# Altium footprint library SMT.PcbLib: 379 footprints (part 24 of 24)
Each footprint in its own frame and in the unit in brackets; x right, y up, seen from the top. Pads: shape width x height; smd on the part's side, far side on the other; paste and mask are expansions set on the pad; w line width, h text height; cw(c..) or ccw(c..) is an arc to the next point about the centre after c.
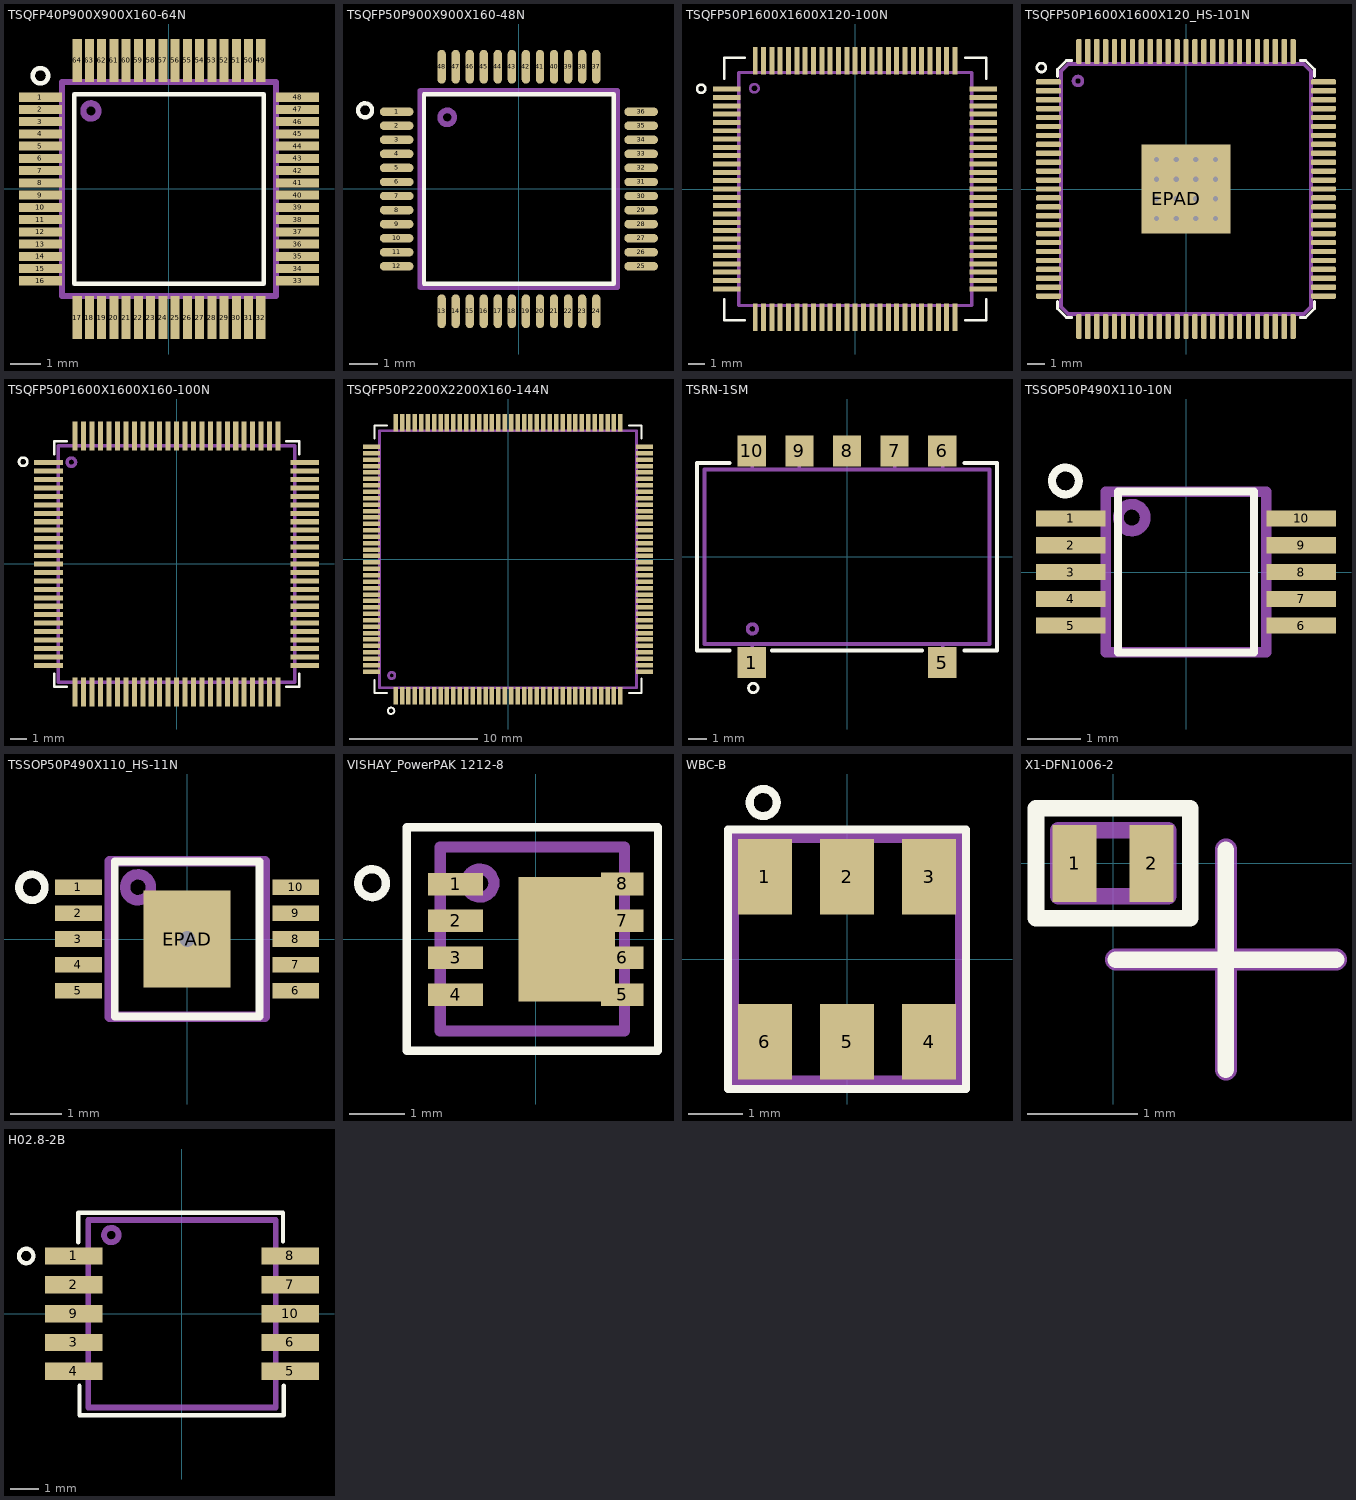
[diagram p23: the footprints below, top view; thin cyan lines are the x and y axes]

## TSQFP40P900X900X160-64N [mm] "TSQFP, 64-Leads, Body 7,00x7,00mm, Pitch 0,40mm, IPC Medium Density"
height 1.6
pads (64):
  rect 1.4x0.3 smd paste-0.05 mask+0.05: 1(-4.2,3) 2(-4.2,2.6) 3(-4.2,2.2) 4(-4.2,1.8) 5(-4.2,1.4) 6(-4.2,1) 7(-4.2,0.6) 8(-4.2,0.2) 9(-4.2,-0.2) 10(-4.2,-0.6) 11(-4.2,-1) 12(-4.2,-1.4) 13(-4.2,-1.8) 14(-4.2,-2.2) 15(-4.2,-2.6) 16(-4.2,-3) 33(4.2,-3) 34(4.2,-2.6) 35(4.2,-2.2) 36(4.2,-1.8) 37(4.2,-1.4) 38(4.2,-1) 39(4.2,-0.6) 40(4.2,-0.2) 41(4.2,0.2) 42(4.2,0.6) 43(4.2,1) 44(4.2,1.4) 45(4.2,1.8) 46(4.2,2.2) 47(4.2,2.6) 48(4.2,3)
  rect 0.3x1.4 smd paste-0.05 mask+0.05: 17(-3,-4.2) 18(-2.6,-4.2) 19(-2.2,-4.2) 20(-1.8,-4.2) 21(-1.4,-4.2) 22(-1,-4.2) 23(-0.6,-4.2) 24(-0.2,-4.2) 25(0.2,-4.2) 26(0.6,-4.2) 27(1,-4.2) 28(1.4,-4.2) 29(1.8,-4.2) 30(2.2,-4.2) 31(2.6,-4.2) 32(3,-4.2) 49(3,4.2) 50(2.6,4.2) 51(2.2,4.2) 52(1.8,4.2) 53(1.4,4.2) 54(1,4.2) 55(0.6,4.2) 56(0.2,4.2) 57(-0.2,4.2) 58(-0.6,4.2) 59(-1,4.2) 60(-1.4,4.2) 61(-1.8,4.2) 62(-2.2,4.2) 63(-2.6,4.2) 64(-3,4.2)
Top Overlay:
  circle w0.15: c-4.2,3.7 r0.25
  lines w0.15: -3.1,-3.1 3.1,-3.1 3.1,3.1 -3.1,3.1 -3.1,-3.1
Mechanical 1:
  circle w0.2: c-2.55,2.55 r0.25
  lines w0.2: -3.5,-3.5 3.5,-3.5 3.5,3.5 -3.5,3.5 -3.5,-3.5
3D body "TSQFP40P900X900X160-64N.step": height 1.6, standoff 0, extent -4.5,-4.5 4.5,4.5

## TSQFP50P900X900X160-48N [mm] "TSQFP, 48-Leads, Body 7,00x7,00mm, Pitch 0,50mm, IPC Medium Density"
height 1.6
pads (48):
  oval 1.2x0.3 smd mask+0.04: 1(-4.35,2.75) 2(-4.35,2.25) 3(-4.35,1.75) 4(-4.35,1.25) 5(-4.35,0.75) 6(-4.35,0.25) 7(-4.35,-0.25) 8(-4.35,-0.75) 9(-4.35,-1.25) 10(-4.35,-1.75) 11(-4.35,-2.25) 12(-4.35,-2.75) 25(4.35,-2.75) 26(4.35,-2.25) 27(4.35,-1.75) 28(4.35,-1.25) 29(4.35,-0.75) 30(4.35,-0.25) 31(4.35,0.25) 32(4.35,0.75) 33(4.35,1.25) 34(4.35,1.75) 35(4.35,2.25) 36(4.35,2.75)
  oval 0.3x1.2 smd mask+0.04: 13(-2.75,-4.35) 14(-2.25,-4.35) 15(-1.75,-4.35) 16(-1.25,-4.35) 17(-0.75,-4.35) 18(-0.25,-4.35) 19(0.25,-4.35) 20(0.75,-4.35) 21(1.25,-4.35) 22(1.75,-4.35) 23(2.25,-4.35) 24(2.75,-4.35) 37(2.75,4.35) 38(2.25,4.35) 39(1.75,4.35) 40(1.25,4.35) 41(0.75,4.35) 42(0.25,4.35) 43(-0.25,4.35) 44(-0.75,4.35) 45(-1.25,4.35) 46(-1.75,4.35) 47(-2.25,4.35) 48(-2.75,4.35)
Top Overlay:
  circle w0.15: c-5.475,2.8 r0.25
  lines w0.15: -3.375,-3.375 -3.375,3.375 3.375,3.375 3.375,-3.375 -3.375,-3.375
Mechanical 1:
  circle w0.2: c-2.55,2.55 r0.25
  lines w0.2: -3.5,-3.5 -3.5,3.5 3.5,3.5 3.5,-3.5 -3.5,-3.5
3D body "TSQFP50P900X900X160-48N.step": height 1.6, standoff 0, extent -4.5,-4.5 4.5,4.5

## TSQFP50P1600X1600X120-100N [mm] "TSQFP, 100-Leads, Body 14,00x14,00mm, Pitch 0,50mm, IPC Medium Density"
height 1.2
pads (100):
  rect 1.65x0.3 smd paste+0 mask+0.01: 1(-7.7,6) 2(-7.7,5.5) 3(-7.7,5) 4(-7.7,4.5) 5(-7.7,4) 6(-7.7,3.5) 7(-7.7,3) 8(-7.7,2.5) 9(-7.7,2) 10(-7.7,1.5) 11(-7.7,1) 12(-7.7,0.5) 13(-7.7,0) 14(-7.7,-0.5) 15(-7.7,-1) 16(-7.7,-1.5) 17(-7.7,-2) 18(-7.7,-2.5) 19(-7.7,-3) 20(-7.7,-3.5) 21(-7.7,-4) 22(-7.7,-4.5) 23(-7.7,-5) 24(-7.7,-5.5) 25(-7.7,-6) 51(7.7,-6) 52(7.7,-5.5) 53(7.7,-5) 54(7.7,-4.5) 55(7.7,-4) 56(7.7,-3.5) 57(7.7,-3) 58(7.7,-2.5) 59(7.7,-2) 60(7.7,-1.5) 61(7.7,-1) 62(7.7,-0.5) 63(7.7,0) 64(7.7,0.5) 65(7.7,1) 66(7.7,1.5) 67(7.7,2) 68(7.7,2.5) 69(7.7,3) 70(7.7,3.5) 71(7.7,4) 72(7.7,4.5) 73(7.7,5) 74(7.7,5.5) 75(7.7,6)
  rect 0.3x1.65 smd paste+0 mask+0.01: 26(-6,-7.7) 27(-5.5,-7.7) 28(-5,-7.7) 29(-4.5,-7.7) 30(-4,-7.7) 31(-3.5,-7.7) 32(-3,-7.7) 33(-2.5,-7.7) 34(-2,-7.7) 35(-1.5,-7.7) 36(-1,-7.7) 37(-0.5,-7.7) 38(0,-7.7) 39(0.5,-7.7) 40(1,-7.7) 41(1.5,-7.7) 42(2,-7.7) 43(2.5,-7.7) 44(3,-7.7) 45(3.5,-7.7) 46(4,-7.7) 47(4.5,-7.7) 48(5,-7.7) 49(5.5,-7.7) 50(6,-7.7) 76(6,7.7) 77(5.5,7.7) 78(5,7.7) 79(4.5,7.7) 80(4,7.7) 81(3.5,7.7) 82(3,7.7) 83(2.5,7.7) 84(2,7.7) 85(1.5,7.7) 86(1,7.7) 87(0.5,7.7) 88(0,7.7) 89(-0.5,7.7) 90(-1,7.7) 91(-1.5,7.7) 92(-2,7.7) 93(-2.5,7.7) 94(-3,7.7) 95(-3.5,7.7) 96(-4,7.7) 97(-4.5,7.7) 98(-5,7.7) 99(-5.5,7.7) 100(-6,7.7)
Top Overlay:
  circle w0.15: c-9.25,6.025 r0.25
  lines w0.15: -7.875,-6.625 -7.875,-7.875 -6.625,-7.875 ; -7.875,6.625 -7.875,7.875 -6.625,7.875 ; 6.625,-7.875 7.875,-7.875 7.875,-6.625 ; 6.625,7.875 7.875,7.875 7.875,6.625
Mechanical 1:
  circle w0.15: c-6.05,6.05 r0.25
  lines w0.2: -7,-7 7,-7 7,7 -7,7 -7,-7
3D body "User Library-LQFP100-3.STEP": height 1.62, standoff -0.01, extent -8.072,-8.072 8.072,8.072

## TSQFP50P1600X1600X120_HS-101N [mm] "TSQFP, 100-Leads, Body 14,00x14,00mm, Pitch 0,50mm, Thermal Pad 5,00x5,00mm, IPC Medium Density"
height 1.2
pads (101):
  rrect50% 1.4x0.3 smd mask+0.05: 1(-7.7,6) 2(-7.7,5.5) 3(-7.7,5) 4(-7.7,4.5) 5(-7.7,4) 6(-7.7,3.5) 7(-7.7,3) 8(-7.7,2.5) 9(-7.7,2) 10(-7.7,1.5) 11(-7.7,1) 12(-7.7,0.5) 13(-7.7,0) 14(-7.7,-0.5) 15(-7.7,-1) 16(-7.7,-1.5) 17(-7.7,-2) 18(-7.7,-2.5) 19(-7.7,-3) 20(-7.7,-3.5) 21(-7.7,-4) 22(-7.7,-4.5) 23(-7.7,-5) 24(-7.7,-5.5) 25(-7.7,-6) 51(7.7,-6) 52(7.7,-5.5) 53(7.7,-5) 54(7.7,-4.5) 55(7.7,-4) 56(7.7,-3.5) 57(7.7,-3) 58(7.7,-2.5) 59(7.7,-2) 60(7.7,-1.5) 61(7.7,-1) 62(7.7,-0.5) 63(7.7,0) 64(7.7,0.5) 65(7.7,1) 66(7.7,1.5) 67(7.7,2) 68(7.7,2.5) 69(7.7,3) 70(7.7,3.5) 71(7.7,4) 72(7.7,4.5) 73(7.7,5) 74(7.7,5.5) 75(7.7,6)
  rrect50% 0.3x1.4 smd mask+0.05: 26(-6,-7.7) 27(-5.5,-7.7) 28(-5,-7.7) 29(-4.5,-7.7) 30(-4,-7.7) 31(-3.5,-7.7) 32(-3,-7.7) 33(-2.5,-7.7) 34(-2,-7.7) 35(-1.5,-7.7) 36(-1,-7.7) 37(-0.5,-7.7) 38(0,-7.7) 39(0.5,-7.7) 40(1,-7.7) 41(1.5,-7.7) 42(2,-7.7) 43(2.5,-7.7) 44(3,-7.7) 45(3.5,-7.7) 46(4,-7.7) 47(4.5,-7.7) 48(5,-7.7) 49(5.5,-7.7) 50(6,-7.7) 76(6,7.7) 77(5.5,7.7) 78(5,7.7) 79(4.5,7.7) 80(4,7.7) 81(3.5,7.7) 82(3,7.7) 83(2.5,7.7) 84(2,7.7) 85(1.5,7.7) 86(1,7.7) 87(0.5,7.7) 88(0,7.7) 89(-0.5,7.7) 90(-1,7.7) 91(-1.5,7.7) 92(-2,7.7) 93(-2.5,7.7) 94(-3,7.7) 95(-3.5,7.7) 96(-4,7.7) 97(-4.5,7.7) 98(-5,7.7) 99(-5.5,7.7) 100(-6,7.7)
  rect 5x5 hole 0.3 copper offset 0.55,0.55: EPAD(-0.55,-0.55)
via 1.65,-1.65 diameter 0.6 hole 0.3
via 0.55,-1.65 diameter 0.6 hole 0.3
via -0.55,-1.65 diameter 0.6 hole 0.3
via -1.65,-1.65 diameter 0.6 hole 0.3
via 1.65,-0.55 diameter 0.6 hole 0.3
via 0.55,-0.55 diameter 0.6 hole 0.3
via -1.65,-0.55 diameter 0.6 hole 0.3
via 1.65,0.55 diameter 0.6 hole 0.3
via 0.55,0.55 diameter 0.6 hole 0.3
via -0.55,0.55 diameter 0.6 hole 0.3
via -1.65,0.55 diameter 0.6 hole 0.3
via 1.65,1.65 diameter 0.6 hole 0.3
via 0.55,1.65 diameter 0.6 hole 0.3
via -0.55,1.65 diameter 0.6 hole 0.3
via -1.65,1.65 diameter 0.6 hole 0.3
Top Overlay:
  circle w0.15: c-8.1,6.8 r0.25
  lines w0.15: -7.2,-6.3 -7.2,-6.7 -6.7,-7.2 -6.4,-7.2 ; -7.2,6.3 -7.2,6.7 -6.7,7.2 -6.4,7.2 ; 6.4,-7.2 6.7,-7.2 7.2,-6.7 7.2,-6.3 ; 6.4,7.2 6.7,7.2 7.2,6.7 7.2,6.3
Top Paste:
  rectangle: -2.3,-2.3 -0.1,2.3
  rectangle: 0.1,-2.3 2.3,2.3
Mechanical 1:
  circle w0.2: c-6.05,6.05 r0.25
  lines w0.2: -7,-6.6 -7,6.6 -6.6,7 6.6,7 7,6.6 7,-6.6 6.6,-7 -6.6,-7 -7,-6.6
3D body "TSQFP50P1600X1600X120_HS-101N.step": height 1.2, standoff 0, extent -8,-8 8,8

## TSQFP50P1600X1600X160-100N [mm] "TSQFP, 100-Leads, Body 14,00x14,00mm, Pitch 0,50mm, IPC Medium Density"
height 1.6
pads (100):
  rect 1.7x0.3 smd paste+0 mask+0.01: 1(-7.575,6) 2(-7.575,5.5) 3(-7.575,5) 4(-7.575,4.5) 5(-7.575,4) 6(-7.575,3.5) 7(-7.575,3) 8(-7.575,2.5) 9(-7.575,2) 10(-7.575,1.5) 11(-7.575,1) 12(-7.575,0.5) 13(-7.575,0) 14(-7.575,-0.5) 15(-7.575,-1) 16(-7.575,-1.5) 17(-7.575,-2) 18(-7.575,-2.5) 19(-7.575,-3) 20(-7.575,-3.5) 21(-7.575,-4) 22(-7.575,-4.5) 23(-7.575,-5) 24(-7.575,-5.5) 25(-7.575,-6) 51(7.575,-6) 52(7.575,-5.5) 53(7.575,-5) 54(7.575,-4.5) 55(7.575,-4) 56(7.575,-3.5) 57(7.575,-3) 58(7.575,-2.5) 59(7.575,-2) 60(7.575,-1.5) 61(7.575,-1) 62(7.575,-0.5) 63(7.575,0) 64(7.575,0.5) 65(7.575,1) 66(7.575,1.5) 67(7.575,2) 68(7.575,2.5) 69(7.575,3) 70(7.575,3.5) 71(7.575,4) 72(7.575,4.5) 73(7.575,5) 74(7.575,5.5) 75(7.575,6)
  rect 0.3x1.7 smd paste+0 mask+0.01: 26(-6,-7.575) 27(-5.5,-7.575) 28(-5,-7.575) 29(-4.5,-7.575) 30(-4,-7.575) 31(-3.5,-7.575) 32(-3,-7.575) 33(-2.5,-7.575) 34(-2,-7.575) 35(-1.5,-7.575) 36(-1,-7.575) 37(-0.5,-7.575) 38(0,-7.575) 39(0.5,-7.575) 40(1,-7.575) 41(1.5,-7.575) 42(2,-7.575) 43(2.5,-7.575) 44(3,-7.575) 45(3.5,-7.575) 46(4,-7.575) 47(4.5,-7.575) 48(5,-7.575) 49(5.5,-7.575) 50(6,-7.575) 76(6,7.575) 77(5.5,7.575) 78(5,7.575) 79(4.5,7.575) 80(4,7.575) 81(3.5,7.575) 82(3,7.575) 83(2.5,7.575) 84(2,7.575) 85(1.5,7.575) 86(1,7.575) 87(0.5,7.575) 88(0,7.575) 89(-0.5,7.575) 90(-1,7.575) 91(-1.5,7.575) 92(-2,7.575) 93(-2.5,7.575) 94(-3,7.575) 95(-3.5,7.575) 96(-4,7.575) 97(-4.5,7.575) 98(-5,7.575) 99(-5.5,7.575) 100(-6,7.575)
Top Overlay:
  circle w0.15: c-9.075,6.05 r0.25
  lines w0.15: -7.25,-6.5 -7.25,-7.25 -6.5,-7.25 ; -7.25,6.5 -7.25,7.25 -6.5,7.25 ; 6.5,-7.25 7.25,-7.25 7.25,-6.5 ; 6.5,7.25 7.25,7.25 7.25,6.5
Mechanical 1:
  circle w0.2: c-6.225,6.025 r0.25
  lines w0.2: -7,-7 -7,7 7,7 7,-7 -7,-7
3D body "SW3dPS-lqfp-100.STEP": height 1.72, standoff 0.01, extent -8,-8 8,8

## TSQFP50P2200X2200X160-144N [mm] "TSQFP, 144-Leads, Body 20,00x20,00mm, Pitch 0,50mm, IPC Medium Density"
height 1.6
pads (144):
  rect 0.35x1.35 smd mask+0.01: 1(-8.75,-10.625) 2(-8.25,-10.625) 3(-7.75,-10.625) 4(-7.25,-10.625) 5(-6.75,-10.625) 6(-6.25,-10.625) 7(-5.75,-10.625) 8(-5.25,-10.625) 9(-4.75,-10.625) 10(-4.25,-10.625) 11(-3.75,-10.625) 12(-3.25,-10.625) 13(-2.75,-10.625) 14(-2.25,-10.625) 15(-1.75,-10.625) 16(-1.25,-10.625) 17(-0.75,-10.625) 18(-0.25,-10.625) 19(0.25,-10.625) 20(0.75,-10.625) 21(1.25,-10.625) 22(1.75,-10.625) 23(2.25,-10.625) 24(2.75,-10.625) 25(3.25,-10.625) 26(3.75,-10.625) 27(4.25,-10.625) 28(4.75,-10.625) 29(5.25,-10.625) 30(5.75,-10.625) 31(6.25,-10.625) 32(6.75,-10.625) 33(7.25,-10.625) 34(7.75,-10.625) 35(8.25,-10.625) 36(8.75,-10.625) 73(8.75,10.625) 74(8.25,10.625) 75(7.75,10.625) 76(7.25,10.625) 77(6.75,10.625) 78(6.25,10.625) 79(5.75,10.625) 80(5.25,10.625) 81(4.75,10.625) 82(4.25,10.625) 83(3.75,10.625) 84(3.25,10.625) 85(2.75,10.625) 86(2.25,10.625) 87(1.75,10.625) 88(1.25,10.625) 89(0.75,10.625) 90(0.25,10.625) 91(-0.25,10.625) 92(-0.75,10.625) 93(-1.25,10.625) 94(-1.75,10.625) 95(-2.25,10.625) 96(-2.75,10.625) 97(-3.25,10.625) 98(-3.75,10.625) 99(-4.25,10.625) 100(-4.75,10.625) 101(-5.25,10.625) 102(-5.75,10.625) 103(-6.25,10.625) 104(-6.75,10.625) 105(-7.25,10.625) 106(-7.75,10.625) 107(-8.25,10.625) 108(-8.75,10.625)
  rect 1.35x0.35 smd mask+0.01: 37(10.625,-8.75) 38(10.625,-8.25) 39(10.625,-7.75) 40(10.625,-7.25) 41(10.625,-6.75) 42(10.625,-6.25) 43(10.625,-5.75) 44(10.625,-5.25) 45(10.625,-4.75) 46(10.625,-4.25) 47(10.625,-3.75) 48(10.625,-3.25) 49(10.625,-2.75) 50(10.625,-2.25) 51(10.625,-1.75) 52(10.625,-1.25) 53(10.625,-0.75) 54(10.625,-0.25) 55(10.625,0.25) 56(10.625,0.75) 57(10.625,1.25) 58(10.625,1.75) 59(10.625,2.25) 60(10.625,2.75) 61(10.625,3.25) 62(10.625,3.75) 63(10.625,4.25) 64(10.625,4.75) 65(10.625,5.25) 66(10.625,5.75) 67(10.625,6.25) 68(10.625,6.75) 69(10.625,7.25) 70(10.625,7.75) 71(10.625,8.25) 72(10.625,8.75) 109(-10.625,8.75) 110(-10.625,8.25) 111(-10.625,7.75) 112(-10.625,7.25) 113(-10.625,6.75) 114(-10.625,6.25) 115(-10.625,5.75) 116(-10.625,5.25) 117(-10.625,4.75) 118(-10.625,4.25) 119(-10.625,3.75) 120(-10.625,3.25) 121(-10.625,2.75) 122(-10.625,2.25) 123(-10.625,1.75) 124(-10.625,1.25) 125(-10.625,0.75) 126(-10.625,0.25) 127(-10.625,-0.25) 128(-10.625,-0.75) 129(-10.625,-1.25) 130(-10.625,-1.75) 131(-10.625,-2.25) 132(-10.625,-2.75) 133(-10.625,-3.25) 134(-10.625,-3.75) 135(-10.625,-4.25) 136(-10.625,-4.75) 137(-10.625,-5.25) 138(-10.625,-5.75) 139(-10.625,-6.25) 140(-10.625,-6.75) 141(-10.625,-7.25) 142(-10.625,-7.75) 143(-10.625,-8.25) 144(-10.625,-8.75)
Top Overlay:
  circle w0.15: c-9.1,-11.8 r0.25
  lines w0.15: -10.4,-9.4 -10.4,-10.4 -9.4,-10.4 ; -10.4,9.4 -10.4,10.4 -9.4,10.4 ; 9.4,-10.4 10.4,-10.4 10.4,-9.3 ; 9.4,10.4 10.4,10.4 10.4,9.4
Mechanical 1:
  circle w0.2: c-9.05,-9.05 r0.25
  lines w0.2: -10,-10 10,-10 10,10 -10,10 -10,-10
3D body "TSQFP50P2200X2200X160-144N.step": height 1.6, standoff 0, extent -11,-11 11,11

## TSRN-1SM [mm] "Compact SMD package 15.2X9.3X7.3"
height 7.3
pads (7):
  rect 1.5x1.65 smd: 1(-5.08,-5.65) 5(5.08,-5.65) 6(5.08,5.65) 7(2.54,5.65) 8(0,5.65) 9(-2.54,5.65) 10(-5.08,5.65)
Top Overlay:
  circle w0.15: c-5,-7 r0.25
  lines w0.2: -6.25,-5 -8,-5 -8,5 -6.25,5 ; -4,-5 4,-5 ; 6.25,-5 8,-5 8,5 6.25,5
Mechanical 1:
  circle w0.2: c-5.05,-3.85 r0.25
  lines w0.2: -5.05,-5.62 -5.05,-4.65 ; -5.05,4.65 -5.05,5.62 ; -2.55,4.65 -2.55,5.64 ; 2.55,4.65 2.55,5.64 ; 5.1,-5.63 5.1,-4.65 ; 5.1,4.65 5.1,5.63 ; -7.6,-4.65 -7.6,4.65 7.6,4.65 7.6,-4.65 -7.6,-4.65
3D body "TRACO TSRN-1SM.stp": height 7.31, standoff 0.01, extent -7.6,-5.91 7.6,5.91

## TSSOP50P490X110-10N [mm] "TSSOP, 10-Leads, Body 3,0x3,0mm (max), Pitch 0,50mm, IPC Medium Density"
height 1.1
pads (10):
  rect 1.3x0.3 smd mask+0.03: 1(-2.15,1) 2(-2.15,0.5) 3(-2.15,0) 4(-2.15,-0.5) 5(-2.15,-1) 6(2.15,-1) 7(2.15,-0.5) 8(2.15,0) 9(2.15,0.5) 10(2.15,1)
Top Overlay:
  circle w0.15: c-2.25,1.7 r0.25
  lines w0.15: -1.27,-1.5 -1.27,1.5 1.27,1.5 1.27,-1.5 -1.27,-1.5
Mechanical 1:
  circle w0.2: c-1.012,1.016 r0.25
  lines w0.2: -1.5,-1.5 -1.5,1.5 1.5,1.5 1.5,-1.5 -1.5,-1.5
3D body "SW3dPS-TSSOP-10.STEP": height 1.1, standoff 0, extent -2.5,-1.5 2.5,1.5

## TSSOP50P490X110_HS-11N [mm] "TSSOP, 10-Leads, Body 3,00x3,00mm, Pitch 0,50mm, Thermal Pad 1,88x1,68mm, IPC Medium Density"
height 1.1
pads (11):
  rect 0.9x0.3 smd mask+0.03: 1(-2.1,1) 2(-2.1,0.5) 3(-2.1,0) 4(-2.1,-0.5) 5(-2.1,-1) 6(2.1,-1) 7(2.1,-0.5) 8(2.1,0) 9(2.1,0.5) 10(2.1,1)
  rect 1.68x1.88 hole 0.3: EPAD(0,0)
Top Overlay:
  circle w0.15: c-3,1 r0.25
  lines w0.15: -1.4,-1.5 -1.4,1.5 1.4,1.5 1.4,-1.5 -1.4,-1.5
Top Paste:
  rectangle: -0.5,-0.5 0.5,0.5
Mechanical 1:
  circle w0.2: c-0.95,1 r0.25
  lines w0.2: -1.5,-1.5 1.5,-1.5 1.5,1.5 -1.5,1.5 -1.5,-1.5
3D body "User Library-DGQ (S-PDSO-G10).STEP": height 1.1, standoff 0, extent -2.518,-1.55 2.518,1.55

## VISHAY_PowerPAK 1212-8 [mm] "P-Channel 40 V (D-S) MOSFET"
height 1.12
pads (9):
  rect 0.99x0.405 smd paste+0 mask+0.05: 1(-1.435,0.99) 2(-1.435,0.33) 3(-1.435,-0.33) 4(-1.435,-0.99)
  rect 0.76x0.407 smd paste+0 mask+0.05: 5(1.55,-0.992) 6(1.55,-0.331) 7(1.55,0.331) 8(1.55,0.992)
  rect 1.725x2.235 smd paste-20 mask+0.05: ""(0.557,0)
Top Overlay:
  circle w0.15: c-2.932,1.006 r0.25
  lines w0.15: -2.307,-1.994 -2.307,2.006 2.193,2.006 2.193,-1.994 -2.307,-1.994
Top Paste:
  rectangle: -0.257,0.131 0.993,1.056
  rectangle: -0.257,-1.044 0.993,-0.119
Mechanical 1:
  circle w0.2: c-0.997,1.007 r0.25
  lines w0.2: -1.707,-1.644 1.593,-1.644 1.593,1.656 -1.707,1.656 -1.707,-1.644
3D body "POWERPAK 1212-8SWLH.STEP": height 1.04, standoff 0, extent -1.65,-1.525 1.65,1.525

## WBC-B [mm] "SMT Mini Wideband Transformer"
height 3.05
pads (6):
  rect 1x1.4 smd: 1(-1.52,1.525) 2(0,1.525) 3(1.52,1.525) 4(1.52,-1.525) 5(0,-1.525) 6(-1.52,-1.525)
Top Overlay:
  circle w0.15: c-1.55,2.9 r0.25
  lines w0.15: -2.2,-2.4 2.2,-2.4 2.2,2.4 -2.2,2.4 -2.2,-2.4
Mechanical 1:
  circle w0.2: c-1.5,1.425 r0.25
  lines w0.2: -2.1,-2.25 2.1,-2.25 2.1,2.25 -2.1,2.25 -2.1,-2.25
3D body "Трансформатор WBCx-xxxx (Coilcraft)1.STEP": height 3.05, standoff 0, extent -2.1,-2.225 2.09,2.225

## X1-DFN1006-2 [mm] "Molded Diode, 2-Leads, Body 1x0.6mm, IPC Medium Density"
height 0.53
pads (2):
  rect 0.4x0.7 smd mask+0.05: 1(-0.35,0) 2(0.35,0)
Top Overlay:
  lines w0.15: 0.025,-0.875 2.025,-0.875 ; 1.025,-1.875 1.025,0.125 ; -0.7,-0.5 0.7,-0.5 0.7,0.5 -0.7,0.5 -0.7,-0.5
Mechanical 1:
  lines w0.15: -0.25,-0.3 -0.25,0.3 ; -0.5,-0.3 0.5,-0.3 0.5,0.3 -0.5,0.3 -0.5,-0.3
  lines w0.2: 0.025,-0.875 2.025,-0.875 ; 1.025,-1.875 1.025,0.125
3D body "X1-DFN1006-2.stp": height 0.48, standoff -0.02, extent -0.5,-0.3 0.5,0.3

## Н02.8-2В [mm] "Установка по РД 107.460000.019 вар. V"
height 2.9
pads (10):
  rect 2x0.6 smd mask+0.08: 1(-3.75,2) 2(-3.75,1) 3(-3.75,-1) 4(-3.75,-2) 5(3.75,-2) 6(3.75,-1) 7(3.75,1) 8(3.75,2) 9(-3.75,0) 10(3.75,0)
Top Overlay:
  circle w0.15: c-5.4,2 r0.25
  lines w0.15: -3.6,2.475 -3.6,3.5 3.5,3.5 ; -3.55,-2.5 -3.55,-3.525 3.525,-3.525 3.525,-2.5 ; 3.5,2.5 3.5,3.5 ; 3.5,3.5 3.5,3.5
Mechanical 1:
  circle w0.2: c-2.45,2.725 r0.25
  lines w0.2: -3.25,-3.25 -3.25,3.25 3.25,3.25 3.25,-3.25 -3.25,-3.25
Mechanical 20:
  text "Установка по РД 107.460000.019" at -9.175,5.298 h1.5
3D body "НО2.8-2В.stp": height 2.91, standoff 0.01, extent -4.525,-3.3 4.525,3.3